# Altium footprint library ADP_Misc.PcbLib: 46 footprints (part 3 of 3)
Each footprint in its own frame and in the unit in brackets; x right, y up, seen from the top. Pads: shape width x height; smd on the part's side, far side on the other; paste and mask are expansions set on the pad; w line width, h text height; cw(c..) or ccw(c..) is an arc to the next point about the centre after c.
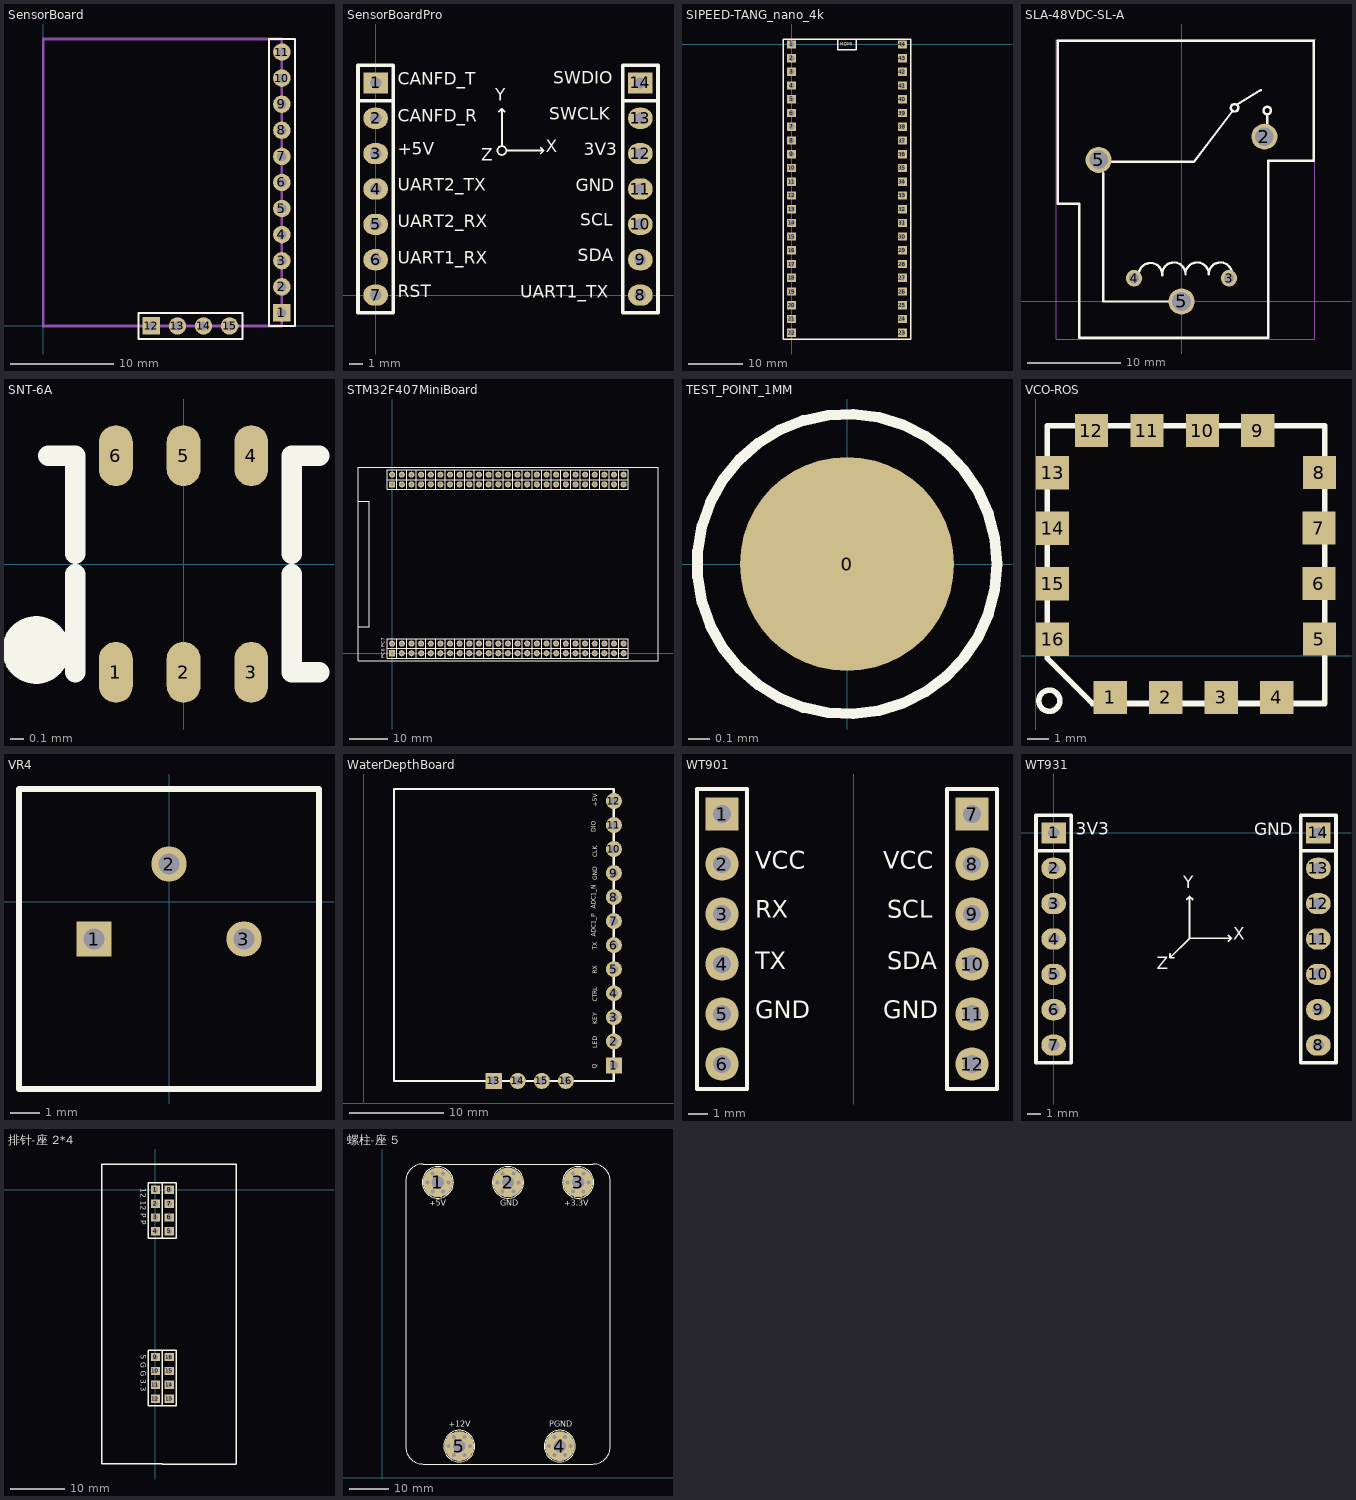
[diagram p2: the footprints below, top view; thin cyan lines are the x and y axes]

## SensorBoard [mm] "舱温水深传感器解算板"
pads (15):
  rect 1.7x1.7 hole 0.9: 1(23.241,1.27) 12(10.541,0)
  round 1.7 hole 0.9: 2(23.241,3.81) 3(23.241,6.35) 4(23.241,8.89) 5(23.241,11.43) 6(23.241,13.97) 7(23.241,16.51) 8(23.241,19.05) 9(23.241,21.59) 10(23.241,24.13) 11(23.241,26.67) 13(13.081,0) 14(15.621,0) 15(18.161,0)
Top Overlay:
  lines w0.2: 9.271,-1.27 9.271,1.27 19.431,1.27 19.431,-1.27 9.271,-1.27 ; 21.971,0 24.511,0 24.511,27.94 21.971,27.94 21.971,0
Mechanical 1:
  lines w0.254: 0,0 23.241,0 23.241,8.382 23.241,27.94 0,27.94 0,8.382 0,0
3D body "HDR2.54-1P.STEP": height 8.5, standoff -3, extent 21.971,25.4 24.511,27.94
3D body "HDR2.54-1P.STEP": height 8.5, standoff -3, extent 21.971,22.86 24.511,25.4
3D body "HDR2.54-1P.STEP": height 8.5, standoff -3, extent 21.971,17.78 24.511,20.32
3D body "HDR2.54-1P.STEP": height 8.5, standoff -3, extent 21.971,20.32 24.511,22.86
3D body "HDR2.54-1P.STEP": height 8.5, standoff -3, extent 21.971,12.7 24.511,15.24
3D body "HDR2.54-1P.STEP": height 8.5, standoff -3, extent 21.971,15.24 24.511,17.78
3D body "HDR2.54-1P.STEP": height 8.5, standoff -3, extent 21.971,10.16 24.511,12.7
3D body "HDR2.54-1P.STEP": height 8.5, standoff -3, extent 21.971,5.08 24.511,7.62
3D body "HDR2.54-1P.STEP": height 8.5, standoff -3, extent 21.971,7.62 24.511,10.16
3D body "HDR2.54-1P.STEP": height 8.5, standoff -3, extent 21.971,0 24.511,2.54
3D body "HDR2.54-1P.STEP": height 8.5, standoff -3, extent 21.971,2.54 24.511,5.08
3D body "HDR2.54-1P.STEP": height 8.5, standoff -3, extent 9.271,-1.27 11.811,1.27
3D body "HDR2.54-1P.STEP": height 8.5, standoff -3, extent 11.811,-1.27 14.351,1.27
3D body "HDR2.54-1P.STEP": height 8.5, standoff -3, extent 14.351,-1.27 16.891,1.27
3D body "HDR2.54-1P.STEP": height 8.5, standoff -3, extent 16.891,-1.27 19.431,1.27

## SensorBoardPro [mil] "常用传感器解算板"
pads (14):
  rect 70x60 hole 32: 1(0,600) 14(748.4,600)
  oval 70x60 hole 32: 2(0,500) 3(0,400) 4(0,300) 5(0,200) 6(0,100) 7(0,0) 8(748.4,0) 9(748.4,100) 10(748.4,200) 11(748.4,300) 12(748.4,400) 13(748.4,500)
Top Overlay:
  circle w5: c356.86,408.82 r12.45
  lines w5: 348.51,518.58 356.86,526.93 ; 356.86,421.27 356.86,526.93 ; 365.21,518.58 356.86,526.93 ; 369.31,408.82 474.97,408.82 ; 466.62,400.47 474.97,408.82 ; 466.62,417.17 474.97,408.82
  lines w10: -50,550 50,550 ; 698.4,550 798.4,550 ; -50,-50 -50,650 50,650 50,-50 -50,-50 ; 698.4,-50 698.4,650 798.4,650 798.4,-50 698.4,-50
  text "UART1_TX" at 409.03,-20.86 h60
  text "SDA" at 570.87,83.31 h60
  text "SCL" at 578.75,183.98 h60
  text "GND" at 565.26,280.85 h60
  text "3V3" at 588.02,382.26 h60
  text "SWCLK" at 490.5,483.05 h60
  text "RST" at 62.99,-18.38 h60
  text "UART1_RX" at 62.99,75.31 h60
  text "UART2_RX" at 62.99,178.48 h60
  text "UART2_TX" at 62.99,281.65 h60
  text "+5V" at 62.99,384.81 h60
  text "CANFD_R" at 62.99,477.83 h60
  text "SWDIO" at 501.77,584.4 h60
  text "CANFD_T" at 62.99,581.5 h60
  text "X" at 480.31,391.68 h60
  text "Y" at 338.61,537.35 h60
  text "Z" at 299.21,366.48 h60
3D body "Female-Header-2.54-Single-7.stp": height 125.98, standoff -334.65, extent 699.2,-54.92 797.62,654.92
3D body "Female-Header-2.54-Single-7.stp": height 125.98, standoff -334.65, extent -49.21,-54.92 49.22,654.92

## SIPEED-TANG_nano_4k [mil]
pads (44):
  rect 65x60 hole 40: 1(0,0) 2(0,-100) 3(0,-200) 4(0,-300) 5(0,-400) 6(0,-500) 7(0,-600) 8(0,-700) 9(0,-800) 10(0,-900) 11(0,-1000) 12(0,-1100) 13(0,-1200) 14(0,-1300) 15(0,-1400) 16(0,-1500) 17(0,-1600) 18(0,-1700) 19(0,-1800) 20(0,-1900) 21(0,-2000) 22(0,-2100) 23(807.09,-2100) 24(807.09,-2000) 25(807.09,-1900) 26(807.09,-1800) 27(807.09,-1700) 28(807.09,-1600) 29(807.09,-1500) 30(807.09,-1400) 31(807.09,-1300) 32(807.09,-1200) 33(807.09,-1100) 34(807.09,-1000) 35(807.09,-900) 36(807.09,-800) 37(807.09,-700) 38(807.09,-600) 39(807.09,-500) 40(807.09,-400) 41(807.09,-300) 42(807.09,-200) 43(807.09,-100) 44(807.09,0)
Top Overlay:
  lines w10: 334.65,39.37 334.65,-39.37 472.44,-39.37 472.44,39.37 ; -59.06,-2145.67 -39.37,-2145.67 0,-2145.67 866.14,-2145.67 866.14,39.37 -59.06,39.37 -59.06,-2145.67
  text "HDMI" at 354.33,-19.68 h39.37

## SLA-48VDC-SL-A [mil]
pads (5):
  round 110 hole 78.8: 2(350.39,696.83)
  round 70 hole 43.4: 3(200.79,98.43) 4(-200.79,98.43)
  round 110 hole 78.74: 5(-350.39,598.43) 5(0,0)
Top Overlay:
  circle w10: c362.23,807.13 r15.8
  circle w10: c224.41,818.9 r15.8
  lines w10: -334.64,590.53 51.95,591.33 216.56,807.13 ; -330.74,543.31 -330.74,0.01 -39.4,0.01 ; -180.24,107.15 cw(c-131.21,113.44) -81.84,111.05 ; -81.84,114.95 cw(c-32.59,115.84) 16.56,118.85 ; 16.56,114.95 cw(c65.81,115.84) 114.96,118.85 ; 114.96,114.95 cw(c164.21,115.84) 213.36,118.85 ; 232.25,830.73 334.65,893.73 ; 362.25,736.23 362.25,791.33 ; 366.14,-137.81 366.14,-110.27 366.14,594.53 559.05,594.53 559.05,1102.33 -523.64,1102.33 -523.64,413.37 -433.06,413.37 -433.06,-153.57 366.14,-153.57 366.14,-74.77 366.14,-15.77
Mechanical 15:
  region: 35.44,0 35.44,4.67 33.02,13.68 28.36,21.76 21.76,28.36 13.68,33.02 4.67,35.44 -4.67,35.44 -13.68,33.02 -21.76,28.36 -28.36,21.76 -33.02,13.68 -35.44,4.67 -35.44,0 -35.44,-4.67 -33.02,-13.68 -28.36,-21.76 -21.76,-28.36 -13.68,-33.02 -4.67,-35.44 4.67,-35.44 13.68,-33.02 21.76,-28.36 28.36,-21.76 33.02,-13.68 35.44,-4.67
  region: 218.55,98.43 218.55,101.96 215.85,108.49 210.85,113.49 204.32,116.19 197.25,116.19 190.73,113.49 185.73,108.49 183.03,101.96 183.03,98.43 183.03,94.9 185.73,88.37 190.73,83.37 197.25,80.67 204.32,80.67 210.85,83.37 215.85,88.37 218.55,94.9
  region: -183.03,98.43 -183.03,101.96 -185.73,108.49 -190.73,113.49 -197.25,116.19 -204.32,116.19 -210.85,113.49 -215.84,108.49 -218.55,101.96 -218.55,98.43 -218.55,94.9 -215.84,88.37 -210.85,83.37 -204.32,80.67 -197.25,80.67 -190.73,83.37 -185.73,88.37 -183.03,94.9
  region: -314.96,598.43 -314.96,603.1 -317.37,612.11 -322.04,620.19 -328.63,626.79 -336.71,631.45 -345.73,633.87 -355.06,633.87 -364.07,631.45 -372.15,626.79 -378.75,620.19 -383.41,612.11 -385.83,603.1 -385.83,598.43 -385.83,593.76 -383.41,584.75 -378.75,576.67 -372.15,570.07 -364.07,565.41 -355.06,562.99 -345.73,562.99 -336.71,565.41 -328.63,570.07 -322.04,576.67 -317.37,584.75 -314.96,593.76
  region: 385.86,696.83 385.86,701.5 383.44,710.52 378.77,718.6 372.17,725.21 364.08,729.87 355.06,732.29 345.73,732.29 336.71,729.87 328.62,725.21 322.02,718.6 317.35,710.52 314.93,701.5 314.93,696.83 314.93,692.16 317.35,683.14 322.02,675.06 328.62,668.45 336.71,663.79 345.73,661.37 355.06,661.37 364.08,663.79 372.17,668.45 378.77,675.06 383.44,683.14 385.86,692.16
  region: 566.42,1107.33 566.42,1108.31 565.03,1109.69 563.08,1109.69 561.69,1108.31 561.69,1107.33 561.69,1106.35 563.08,1104.97 565.03,1104.97 566.42,1106.35
  lines w2: -528.64,-158.57 -528.64,1107.33 564.05,1107.33 564.05,-158.57 -528.64,-158.57

## SNT-6A [mm]
height 0.5
pads (6):
  oval 0.25x0.45 smd: 1(-0.5,-0.8) 2(0,-0.8) 3(0.5,-0.8) 4(0.5,0.8) 5(0,0.8) 6(-0.5,0.8)
Top Overlay:
  circle w0.25: c-1.09,-0.635 r0.125
  lines w0.152: -1,0.8 -0.8,0.8 -0.8,0.075 ; -0.8,-0.8 -0.8,-0.075 ; 0.8,-0.075 0.8,-0.8 1,-0.8 ; 0.8,0.075 0.8,0.8 1,0.8
3D body "SNT-6A.STEP": height 0.5, standoff 0, extent -0.799,-0.898 0.799,0.9

## STM32F407MiniBoard [mm]
pads (100):
  rect 1.6x1.6 hole 0.9: 1(0,0) 51(0,44.475)
  round 1.6 hole 0.9: 2(0,2.54) 3(2.54,0) 4(2.54,2.54) 5(5.08,0) 6(5.08,2.54) 7(7.62,0) 8(7.62,2.54) 9(10.16,0) 10(10.16,2.54) 11(12.7,0) 12(12.7,2.54) 13(15.24,0) 14(15.24,2.54) 15(17.78,0) 16(17.78,2.54) 17(20.32,0) 18(20.32,2.54) 19(22.86,0) 20(22.86,2.54) 21(25.4,0) 22(25.4,2.54) 23(27.94,0) 24(27.94,2.54) 25(30.48,0) 26(30.48,2.54) 27(33.02,0) 28(33.02,2.54) 29(35.56,0) 30(35.56,2.54) 31(38.1,0) 32(38.1,2.54) 33(40.64,0) 34(40.64,2.54) 35(43.18,0) 36(43.18,2.54) 37(45.72,0) 38(45.72,2.54) 39(48.26,0) 40(48.26,2.54) 41(50.8,0) 42(50.8,2.54) 43(53.34,0) 44(53.34,2.54) 45(55.88,0) 46(55.88,2.54) 47(58.42,0) 48(58.42,2.54) 49(60.96,0) 50(60.96,2.54) 52(2.54,44.475) 53(5.08,44.475) 54(7.62,44.475) 55(10.16,44.475) 56(12.7,44.475) 57(15.24,44.475) 58(17.78,44.475) 59(20.32,44.475) 60(22.86,44.475) 61(25.4,44.475) 62(27.94,44.475) 63(30.48,44.475) 64(33.02,44.475) 65(35.56,44.475) 66(38.1,44.475) 67(40.64,44.475) 68(43.18,44.475) 69(45.72,44.475) 70(48.26,44.475) 71(50.8,44.475) 72(53.34,44.475) 73(55.88,44.475) 74(58.42,44.475) 75(60.96,44.475) 76(60.96,47.015) 77(58.42,47.015) 78(55.88,47.015) 79(53.34,47.015) 80(50.8,47.015) 81(48.26,47.015) 82(45.72,47.015) 83(43.18,47.015) 84(40.64,47.015) 85(38.1,47.015) 86(35.56,47.015) 87(33.02,47.015) 88(30.48,47.015) 89(27.94,47.015) 90(25.4,47.015) 91(22.86,47.015) 92(20.32,47.015) 93(17.78,47.015) 94(15.24,47.015) 95(12.7,47.015) 96(10.16,47.015) 97(7.62,47.015) 98(5.08,47.015) 99(2.54,47.015) 100(0,47.015)
Top Overlay:
  lines w0.2: 62.23,-1.27 -1.27,-1.27 -1.27,3.81 62.23,3.81 ; 62.23,43.205 -1.27,43.205 -1.27,48.285 62.23,48.285
  lines w0.203: -1.27,1.27 62.23,1.27 ; -1.27,45.745 62.23,45.745 ; 1.27,-1.27 1.27,3.81 ; 1.27,43.205 1.27,48.285 ; 3.81,-1.27 3.81,3.81 ; 3.81,43.205 3.81,48.285 ; 6.35,-1.27 6.35,3.81 ; 6.35,43.205 6.35,48.285 ; 8.89,-1.27 8.89,3.81 ; 8.89,43.205 8.89,48.285 ; 11.43,-1.27 11.43,3.81 ; 11.43,43.205 11.43,48.285 ; 13.97,-1.27 13.97,3.81 ; 13.97,43.205 13.97,48.285 ; 16.51,-1.27 16.51,3.81 ; 16.51,43.205 16.51,48.285 ; 19.05,-1.27 19.05,3.81 ; 19.05,43.205 19.05,48.285 ; 21.59,-1.27 21.59,3.81 ; 21.59,43.205 21.59,48.285 ; 24.13,-1.27 24.13,3.81 ; 24.13,43.205 24.13,48.285 ; 26.67,-1.27 26.67,3.81 ; 26.67,43.205 26.67,48.285 ; 29.21,-1.27 29.21,3.81 ; 29.21,43.205 29.21,48.285 ; 31.75,-1.27 31.75,3.81 ; 31.75,43.205 31.75,48.285 ; 34.29,-1.27 34.29,3.81 ; 34.29,43.205 34.29,48.285 ; 36.83,-1.27 36.83,3.81 ; 36.83,43.205 36.83,48.285 ; 39.37,-1.27 39.37,3.81 ; 39.37,43.205 39.37,48.285 ; 41.91,-1.27 41.91,3.81 ; 41.91,43.205 41.91,48.285 ; 44.45,-1.27 44.45,3.81 ; 44.45,43.205 44.45,48.285 ; 46.99,-1.27 46.99,3.81 ; 46.99,43.205 46.99,48.285 ; 49.53,-1.27 49.53,3.81 ; 49.53,43.205 49.53,48.285 ; 52.07,-1.27 52.07,3.81 ; 52.07,43.205 52.07,48.285 ; 54.61,-1.27 54.61,3.81 ; 54.61,43.205 54.61,48.285 ; 57.15,-1.27 57.15,3.81 ; 57.15,43.205 57.15,48.285 ; 59.69,-1.27 59.69,3.81 ; 59.69,43.205 59.69,48.285 ; 62.23,-1.27 62.23,3.81 ; 62.23,43.205 62.23,48.285
  lines w0.254: -9,7 -8,7 -6,7 -6,40 -9,40 ; -9,-2 -9,48.285 -9,49 62.23,49 70,49 70,-2 -1.27,-2 -9,-2
  text "PC6 PC7" at -2,-1.27 h1
3D body "HDR2.54-1x2P.STEP": height 8.5, standoff -3, extent 57.15,-1.27 59.69,3.81
3D body "HDR2.54-1x2P.STEP": height 8.5, standoff -3, extent 49.53,-1.27 52.07,3.81
3D body "HDR2.54-1x2P.STEP": height 8.5, standoff -3, extent 54.61,-1.27 57.15,3.81
3D body "HDR2.54-1x2P.STEP": height 8.5, standoff -3, extent 52.07,-1.27 54.61,3.81
3D body "HDR2.54-1x2P.STEP": height 8.5, standoff -3, extent 59.69,-1.27 62.23,3.81
3D body "HDR2.54-1x2P.STEP": height 8.5, standoff -3, extent 41.91,-1.27 44.45,3.81
3D body "HDR2.54-1x2P.STEP": height 8.5, standoff -3, extent 44.45,-1.27 46.99,3.81
3D body "HDR2.54-1x2P.STEP": height 8.5, standoff -3, extent 36.83,-1.27 39.37,3.81
3D body "HDR2.54-1x2P.STEP": height 8.5, standoff -3, extent 39.37,-1.27 41.91,3.81
3D body "HDR2.54-1x2P.STEP": height 8.5, standoff -3, extent 46.99,-1.27 49.53,3.81
3D body "HDR2.54-1x2P.STEP": height 8.5, standoff -3, extent 29.21,-1.27 31.75,3.81
3D body "HDR2.54-1x2P.STEP": height 8.5, standoff -3, extent 31.75,-1.27 34.29,3.81
3D body "HDR2.54-1x2P.STEP": height 8.5, standoff -3, extent 24.13,-1.27 26.67,3.81
3D body "HDR2.54-1x2P.STEP": height 8.5, standoff -3, extent 26.67,-1.27 29.21,3.81
3D body "HDR2.54-1x2P.STEP": height 8.5, standoff -3, extent 34.29,-1.27 36.83,3.81
3D body "HDR2.54-1x2P.STEP": height 8.5, standoff -3, extent 16.51,-1.27 19.05,3.81
3D body "HDR2.54-1x2P.STEP": height 8.5, standoff -3, extent 19.05,-1.27 21.59,3.81
3D body "HDR2.54-1x2P.STEP": height 8.5, standoff -3, extent 11.43,-1.27 13.97,3.81
3D body "HDR2.54-1x2P.STEP": height 8.5, standoff -3, extent 13.97,-1.27 16.51,3.81
3D body "HDR2.54-1x2P.STEP": height 8.5, standoff -3, extent 21.59,-1.27 24.13,3.81
3D body "HDR2.54-1x2P.STEP": height 8.5, standoff -3, extent 3.81,-1.27 6.35,3.81
3D body "HDR2.54-1x2P.STEP": height 8.5, standoff -3, extent 6.35,-1.27 8.89,3.81
3D body "HDR2.54-1x2P.STEP": height 8.5, standoff -3, extent -1.27,-1.27 1.27,3.81
3D body "HDR2.54-1x2P.STEP": height 8.5, standoff -3, extent 1.27,-1.27 3.81,3.81
3D body "HDR2.54-1x2P.STEP": height 8.5, standoff -3, extent 8.89,-1.27 11.43,3.81
3D body "HDR2.54-1x2P.STEP": height 8.5, standoff -3, extent 8.89,43.205 11.43,48.285
3D body "HDR2.54-1x2P.STEP": height 8.5, standoff -3, extent 1.27,43.205 3.81,48.285
3D body "HDR2.54-1x2P.STEP": height 8.5, standoff -3, extent -1.27,43.205 1.27,48.285
3D body "HDR2.54-1x2P.STEP": height 8.5, standoff -3, extent 6.35,43.205 8.89,48.285
3D body "HDR2.54-1x2P.STEP": height 8.5, standoff -3, extent 3.81,43.205 6.35,48.285
3D body "HDR2.54-1x2P.STEP": height 8.5, standoff -3, extent 21.59,43.205 24.13,48.285
3D body "HDR2.54-1x2P.STEP": height 8.5, standoff -3, extent 13.97,43.205 16.51,48.285
3D body "HDR2.54-1x2P.STEP": height 8.5, standoff -3, extent 11.43,43.205 13.97,48.285
3D body "HDR2.54-1x2P.STEP": height 8.5, standoff -3, extent 19.05,43.205 21.59,48.285
3D body "HDR2.54-1x2P.STEP": height 8.5, standoff -3, extent 16.51,43.205 19.05,48.285
3D body "HDR2.54-1x2P.STEP": height 8.5, standoff -3, extent 34.29,43.205 36.83,48.285
3D body "HDR2.54-1x2P.STEP": height 8.5, standoff -3, extent 26.67,43.205 29.21,48.285
3D body "HDR2.54-1x2P.STEP": height 8.5, standoff -3, extent 24.13,43.205 26.67,48.285
3D body "HDR2.54-1x2P.STEP": height 8.5, standoff -3, extent 31.75,43.205 34.29,48.285
3D body "HDR2.54-1x2P.STEP": height 8.5, standoff -3, extent 29.21,43.205 31.75,48.285
3D body "HDR2.54-1x2P.STEP": height 8.5, standoff -3, extent 46.99,43.205 49.53,48.285
3D body "HDR2.54-1x2P.STEP": height 8.5, standoff -3, extent 39.37,43.205 41.91,48.285
3D body "HDR2.54-1x2P.STEP": height 8.5, standoff -3, extent 36.83,43.205 39.37,48.285
3D body "HDR2.54-1x2P.STEP": height 8.5, standoff -3, extent 44.45,43.205 46.99,48.285
3D body "HDR2.54-1x2P.STEP": height 8.5, standoff -3, extent 41.91,43.205 44.45,48.285
3D body "HDR2.54-1x2P.STEP": height 8.5, standoff -3, extent 59.69,43.205 62.23,48.285
3D body "HDR2.54-1x2P.STEP": height 8.5, standoff -3, extent 52.07,43.205 54.61,48.285
3D body "HDR2.54-1x2P.STEP": height 8.5, standoff -3, extent 54.61,43.205 57.15,48.285
3D body "HDR2.54-1x2P.STEP": height 8.5, standoff -3, extent 49.53,43.205 52.07,48.285
3D body "HDR2.54-1x2P.STEP": height 8.5, standoff -3, extent 57.15,43.205 59.69,48.285

## TEST_POINT_1MM [mm] "1mm直径测试点"
pads (1):
  round 1 smd: 0(0,0)
Top Overlay:
  circle w0.05: c0,0 r0.7

## VCO-ROS [mm] "ROS-425-319"
height 5.33
pads (16):
  rect 1.52x1.52 smd: 1(3.404,-1.905) 2(5.944,-1.905) 3(8.484,-1.905) 4(11.024,-1.905) 5(12.979,0.768) 6(12.954,3.308) 7(12.954,5.848) 8(12.979,8.388) 9(10.16,10.312) 10(7.62,10.312) 11(5.08,10.312) 12(2.54,10.312) 13(0.762,8.382) 14(0.762,5.842) 15(0.762,3.302) 16(0.762,0.762)
Top Overlay:
  circle w0.254: c0.61,-2.057 r0.483
  lines w0.254: 0.508,-0.108 2.584,-2.184 13.233,-2.184 13.233,10.541 0.508,10.541 0.508,-0.108
3D body "ROS-425-319 in CK605 case detailed.step": height 4.57, standoff 0, extent 0.508,-2.184 13.208,10.516

## VR4 [mm] "Feed-Through Capacitor; 3 Leads"
pads (3):
  rect 1.2x1.2 hole 0.7: 1(-2.54,-1.27)
  round 1.2 hole 0.7: 2(0,1.27) 3(2.54,-1.27)
Top Overlay:
  lines w0.2: -5.08,-6.35 -5.08,3.81 2.54,3.81 5.08,3.81 5.08,-6.35 -5.08,-6.35
3D body "vr4.STEP": height 6, standoff 0, extent -5.022,-6.321 4.978,3.679

## WaterDepthBoard [mm]
pads (16):
  rect 1.7x1.7 hole 0.9: 1(26.468,3.99) 13(13.768,2.339)
  round 1.7 hole 0.9: 2(26.468,6.53) 3(26.468,9.07) 4(26.468,11.61) 5(26.468,14.15) 6(26.468,16.69) 7(26.468,19.23) 8(26.468,21.77) 9(26.468,24.31) 10(26.468,26.85) 11(26.468,29.39) 12(26.468,31.93) 14(16.308,2.339) 15(18.848,2.339) 16(21.388,2.339)
Top Overlay:
  lines w0.254: 3.227,2.339 26.468,2.339 26.468,13.642 26.468,33.2 3.227,33.2 3.227,13.642 3.227,2.339
  text "+5V" at 24.846,31.311 h0.76
  text "DIO" at 24.719,28.644 h0.76
  text "CLK" at 24.846,25.977 h0.76
  text "GND" at 24.846,23.564 h0.76
  text "ADC1_N" at 24.719,20.516 h0.76
  text "ADC1_P" at 24.719,17.595 h0.76
  text "TX" at 24.854,16.198 h0.76
  text "RX" at 24.854,13.658 h0.76
  text "CTRL" at 24.846,10.737 h0.76
  text "KEY" at 24.854,8.324 h0.76
  text "LED" at 24.854,5.784 h0.76
  text "Q" at 24.816,3.625 h0.76

## WT901 [mm] "维特智能九轴模块"
pads (12):
  rect 1.7x1.7 hole 0.9: 1(-6.7,-8.2) 7(6,-8.2)
  round 1.7 hole 0.9: 2(-6.7,-10.74) 3(-6.7,-13.28) 4(-6.7,-15.82) 5(-6.7,-18.36) 6(-6.7,-20.9) 8(6,-10.74) 9(6,-13.28) 10(6,-15.82) 11(6,-18.36) 12(6,-20.9)
Top Overlay:
  lines w0.2: -7.97,-22.17 -7.97,-6.93 -5.43,-6.93 -5.43,-22.17 -7.97,-22.17 ; 4.73,-22.17 4.73,-6.93 7.27,-6.93 7.27,-22.17 4.73,-22.17
  text "VCC" at -4.999,-11.284 h1.52
  text "VCC" at 1.499,-11.284 h1.52
  text "GND" at -5,-18.884 h1.52
  text "GND" at 1.499,-18.884 h1.52
  text "SDA" at 1.697,-16.384 h1.52
  text "SCL" at 1.699,-13.784 h1.52
  text "RX" at -5,-13.783 h1.52
  text "TX" at -5,-16.383 h1.52
3D body "HDR2.54-1P_M.STEP": height 8.5, standoff -3, extent -7.97,-19.63 -5.43,-17.09
3D body "HDR2.54-1P_M.STEP": height 8.5, standoff -3, extent -7.97,-17.09 -5.43,-14.55
3D body "HDR2.54-1P_M.STEP": height 8.5, standoff -3, extent -7.97,-22.17 -5.43,-19.63
3D body "HDR2.54-1P_M.STEP": height 8.5, standoff -3, extent -7.97,-12.01 -5.43,-9.47
3D body "HDR2.54-1P_M.STEP": height 8.5, standoff -3, extent -7.97,-9.47 -5.43,-6.93
3D body "HDR2.54-1P_M.STEP": height 8.5, standoff -3, extent -7.97,-14.55 -5.43,-12.01
3D body "HDR2.54-1P_M.STEP": height 8.5, standoff -3, extent 4.73,-19.63 7.27,-17.09
3D body "HDR2.54-1P_M.STEP": height 8.5, standoff -3, extent 4.73,-17.09 7.27,-14.55
3D body "HDR2.54-1P_M.STEP": height 8.5, standoff -3, extent 4.73,-22.17 7.27,-19.63
3D body "HDR2.54-1P_M.STEP": height 8.5, standoff -3, extent 4.73,-12.01 7.27,-9.47
3D body "HDR2.54-1P_M.STEP": height 8.5, standoff -3, extent 4.73,-9.47 7.27,-6.93
3D body "HDR2.54-1P_M.STEP": height 8.5, standoff -3, extent 4.73,-14.55 7.27,-12.01

## WT931 [mil]
pads (14):
  rect 70x60 hole 32: 1(0,0) 14(748.4,0)
  oval 70x60 hole 32: 2(0,-100) 3(0,-200) 4(0,-300) 5(0,-400) 6(0,-500) 7(0,-600) 8(748.4,-600) 9(748.4,-500) 10(748.4,-400) 11(748.4,-300) 12(748.4,-200) 13(748.4,-100)
Top Overlay:
  lines w5: 329.02,-341.41 329.02,-353.22 ; 340.83,-353.22 329.02,-353.22 ; 376.07,-188.06 384.42,-179.71 ; 384.7,-297.54 329.02,-353.22 ; 392.77,-188.06 384.42,-179.71 ; 494.18,-306.17 502.53,-297.82 ; 494.18,-289.47 502.53,-297.82 ; 384.42,-179.71 384.42,-297.82 502.53,-297.82
  lines w10: -50,-50 50,-50 ; 698.4,-50 798.4,-50 ; -50,-650 -50,50 50,50 50,-650 -50,-650 ; 698.4,-650 698.4,50 798.4,50 798.4,-650 698.4,-650
  text "GND" at 566.93,-19.05 h60
  text "3V3" at 62.99,-18.33 h60
  text "X" at 507.87,-314.96 h60
  text "Y" at 366.17,-169.29 h60
  text "Z" at 291.34,-397.64 h60
3D body "Female-Header-2.54-Single-7.stp": height 125.98, standoff -334.65, extent 699.2,-654.92 797.62,54.92
3D body "Female-Header-2.54-Single-7.stp": height 125.98, standoff -334.65, extent -49.21,-654.92 49.22,54.92

## 排针-座 2*4 [mil]
pads (16):
  rect 65x60 hole 40: 1(0,0) 2(0,-100) 3(0,-200) 4(0,-300) 5(100,-300) 6(100,-200) 7(100,-100) 8(100,0) 9(0,-1205) 10(0,-1305) 11(0,-1405) 12(0,-1505) 13(100,-1505) 14(100,-1405) 15(100,-1305) 16(100,-1205)
Top Overlay:
  lines w10: -384.96,-1974.92 -384.96,185.08 49.96,185.08 50,185.04 581.5,185.04 581.5,-1974.96 ; -384.92,-1974.96 50,-1974.96 50.04,-1975 581.54,-1975 ; 50,-1555 50,-1155 ; 50,-350 50,50 ; -50,-1555 -50,-1155 150,-1155 150,-1555 -50,-1555 ; -50,-350 150,-350 150,50 -50,50 -50,-350
  text "12 12 P P" at -105,10 h39.37
  text "5 G G 3.3" at -105,-1190 h39.37

## 螺柱-座 5 [mil]
pads (35):
  round 40 hole 40: 1(455.17,2966.81) 1(508.17,2875.01) 1(508.17,3058.61) 1(614.17,2875.01) 1(614.17,3058.61) 1(667.17,2966.81) 2(1160.17,2966.81) 2(1213.17,2875.01) 2(1213.17,3058.61) 2(1319.17,2875.01) 2(1319.17,3058.61) 2(1372.17,2966.81) 3(1865.17,2966.81) 3(1918.17,2875.01) 3(1918.17,3058.61) 3(2024.17,2875.01) 3(2024.17,3058.61) 3(2077.17,2966.81) 4(1680.17,316.81) 4(1733.17,225.01) 4(1733.17,408.61) 4(1839.17,225.01) 4(1839.17,408.61) 4(1892.17,316.81) 5(670.17,316.81) 5(723.17,225.01) 5(723.17,408.61) 5(829.17,225.01) 5(829.17,408.61) 5(882.17,316.81)
  round 300 hole 125: 1(561.17,2966.81) 2(1266.17,2966.81) 3(1971.17,2966.81) 4(1786.17,316.81) 5(776.17,316.81)
Bottom Layer:
  region: 516.91,2928.12 521.58,2932.93 532.63,2946.1 535.34,2950.08 537.55,2953.84 539.27,2957.4 540.5,2960.75 541.24,2963.89 541.48,2966.82 561.18,2947.13 558.25,2946.88 555.11,2946.14 551.76,2944.91 548.2,2943.19 544.44,2940.98 540.46,2938.27 536.28,2935.08 527.28,2927.22 522.48,2922.55
  lines w7.87: 488.85,2894.49 491.44,2897.09 ; 517.04,2922.68 561.17,2966.81 ; 561.17,2966.81 561.17,2966.81
  lines w39.37: 1865.17,2966.81 1865.17,2966.81
Top Overlay:
  circle w10: c561.17,2966.81 r157.48
  circle w10: c1971.17,2966.81 r157.48
  circle w10: c1786.17,316.81 r157.48
  circle w10: c1266.17,2966.81 r157.48
  circle w10: c776.17,316.81 r157.48
  lines w10: 236.17,316.81 ccw(c416.17,316.81) 416.17,136.81 2116.17,136.81 ccw(c2116.17,316.81) 2296.17,316.81 2296.17,2971.81 ccw(c2116.17,2971.81) 2116.17,3151.81 416.17,3151.81 ccw(c416.17,2971.81) 236.17,2971.81 236.17,316.81
  text "+5V" at 472.44,2731.81 h60
  text "GND" at 1186.17,2731.81 h60
  text "+3.3V" at 1830.71,2731.81 h60
  text "+12V" at 669.29,511.81 h60
  text "PGND" at 1680.17,511.81 h60
3D body "M3x14.STEP": height 553.16, standoff 1.96, extent 669.95,224.29 882.39,409.33
3D body "M3x14.STEP": height 553.16, standoff 1.96, extent 1679.94,224.29 1892.39,409.33
3D body "M3x14.STEP": height 553.16, standoff 1.96, extent 454.94,2874.29 667.39,3059.33
3D body "M3x14.STEP": height 553.16, standoff 1.96, extent 1864.94,2874.29 2077.39,3059.33
3D body "M3x14.STEP": height 553.16, standoff 1.96, extent 1159.94,2874.29 1372.39,3059.33